# Altium footprint library LukaLIBRARY.PcbLib: 784 footprints (part 22 of 49)
Each footprint in its own frame and in the unit in brackets; x right, y up, seen from the top. Pads: shape width x height; smd on the part's side, far side on the other; paste and mask are expansions set on the pad; w line width, h text height; cw(c..) or ccw(c..) is an arc to the next point about the centre after c.
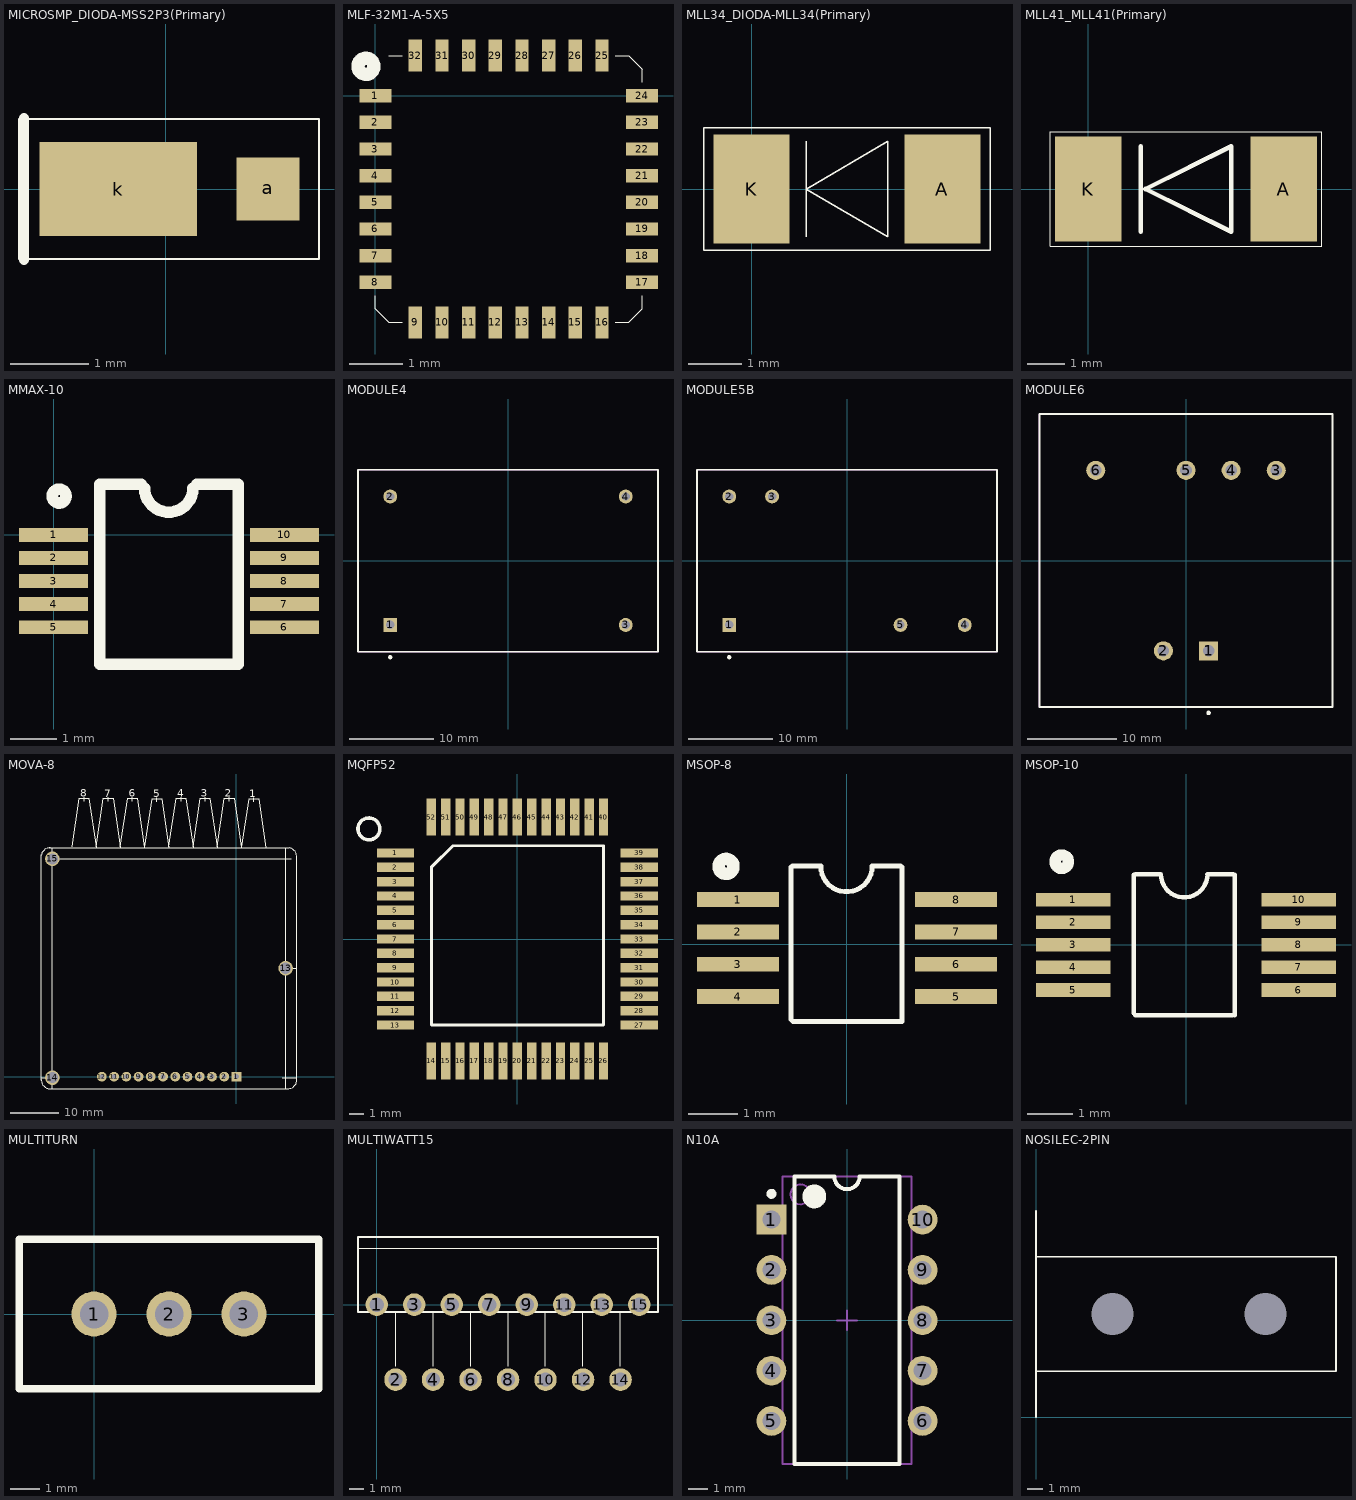
[diagram p21: the footprints below, top view; thin cyan lines are the x and y axes]

## MICROSMP_DIODA-MSS2P3(Primary) [mm]
pads (2):
  rect 0.8x0.8 smd mask-25.4: a(1.3,0)
  rect 2x1.2 smd mask-25.4: k(-0.6,0)
Top Overlay:
  lines w0.025: -1.862,-0.889 -1.862,0.889 1.948,0.889 1.948,-0.889 -1.862,-0.889
  lines w0.127: -1.8,-0.9 -1.8,0.9
Top Solder:
  region: 0.665,-0.711 1.935,-0.711 1.935,0.711 0.665,0.711
  region: 0.111,-0.635 0.111,0.635 -1.311,0.635 -1.311,-0.635

## MLF-32M1-A-5X5 [mm]
pads (32):
  rect 0.6x0.25 smd mask-25.4: 1(0,0) 2(0,-0.5) 3(0,-1) 4(0,-1.5) 5(0,-2) 6(0,-2.5) 7(0,-3) 8(0,-3.5) 17(5,-3.5) 18(5,-3) 19(5,-2.5) 20(5,-2) 21(5,-1.5) 22(5,-1) 23(5,-0.5) 24(5,0)
  rect 0.25x0.6 smd mask-25.4: 9(0.75,-4.25) 10(1.25,-4.25) 11(1.75,-4.25) 12(2.25,-4.25) 13(2.75,-4.25) 14(3.25,-4.25) 15(3.75,-4.25) 16(4.25,-4.25) 25(4.25,0.75) 26(3.75,0.75) 27(3.25,0.75) 28(2.75,0.75) 29(2.25,0.75) 30(1.75,0.75) 31(1.25,0.75) 32(0.75,0.75)
Top Overlay:
  circle w0.25: c-0.175,0.55 r0.15
  lines w0.01: 0,-3.75 0,-4 0.25,-4.25 0.5,-4.25 ; 0.25,0.75 0.5,0.75 ; 4.5,-4.25 4.75,-4.25 5,-4 5,-3.75 ; 4.5,0.75 4.75,0.75 5,0.5 5,0.25
Top Solder:
  region: 2.875,0.45 2.875,1.05 2.625,1.05 2.625,0.45
  region: 2.875,-4.55 2.875,-3.95 2.625,-3.95 2.625,-4.55
  region: 5.3,-2.875 4.7,-2.875 4.7,-3.125 5.3,-3.125
  region: 5.3,-3.375 4.7,-3.375 4.7,-3.625 5.3,-3.625
  region: 0.3,-3.375 -0.3,-3.375 -0.3,-3.625 0.3,-3.625
  region: 0.3,-2.875 -0.3,-2.875 -0.3,-3.125 0.3,-3.125
  region: 3.375,0.45 3.375,1.05 3.125,1.05 3.125,0.45
  region: 3.875,0.45 3.875,1.05 3.625,1.05 3.625,0.45
  region: 4.375,0.45 4.375,1.05 4.125,1.05 4.125,0.45
  region: 5.3,0.125 4.7,0.125 4.7,-0.125 5.3,-0.125
  region: 5.3,-0.375 4.7,-0.375 4.7,-0.625 5.3,-0.625
  region: 5.3,-0.875 4.7,-0.875 4.7,-1.125 5.3,-1.125
  region: 5.3,-1.375 4.7,-1.375 4.7,-1.625 5.3,-1.625
  region: 5.3,-1.875 4.7,-1.875 4.7,-2.125 5.3,-2.125
  region: 5.3,-2.375 4.7,-2.375 4.7,-2.625 5.3,-2.625
  region: 4.375,-4.55 4.375,-3.95 4.125,-3.95 4.125,-4.55
  region: 3.875,-4.55 3.875,-3.95 3.625,-3.95 3.625,-4.55
  region: 3.375,-4.55 3.375,-3.95 3.125,-3.95 3.125,-4.55
  region: 0.3,0.125 -0.3,0.125 -0.3,-0.125 0.3,-0.125
  region: 0.875,0.45 0.875,1.05 0.625,1.05 0.625,0.45
  region: 1.375,0.45 1.375,1.05 1.125,1.05 1.125,0.45
  region: 1.875,0.45 1.875,1.05 1.625,1.05 1.625,0.45
  region: 2.375,0.45 2.375,1.05 2.125,1.05 2.125,0.45
  region: 0.3,-2.375 -0.3,-2.375 -0.3,-2.625 0.3,-2.625
  region: 0.3,-1.875 -0.3,-1.875 -0.3,-2.125 0.3,-2.125
  region: 0.3,-1.375 -0.3,-1.375 -0.3,-1.625 0.3,-1.625
  region: 0.3,-0.875 -0.3,-0.875 -0.3,-1.125 0.3,-1.125
  region: 0.3,-0.375 -0.3,-0.375 -0.3,-0.625 0.3,-0.625
  region: 2.375,-4.55 2.375,-3.95 2.125,-3.95 2.125,-4.55
  region: 1.875,-4.55 1.875,-3.95 1.625,-3.95 1.625,-4.55
  region: 1.375,-4.55 1.375,-3.95 1.125,-3.95 1.125,-4.55
  region: 0.875,-4.55 0.875,-3.95 0.625,-3.95 0.625,-4.55

## MLL34_DIODA-MLL34(Primary) [mil]
pads (2):
  rect 56x80 smd mask-1000: A(140,0) K(0,0)
Top Overlay:
  lines w1: 40,-35 40,35 ; -35,-45 -35,45 175,45 175,-45 -35,-45 ; 40,0 100,35 100,-35 40,0
Top Solder:
  region: -28,-40 28,-40 28,40 -28,40
  region: 112,-40 168,-40 168,40 112,40

## MLL41_MLL41(Primary) [mil]
pads (2):
  rect 70x110 smd: A(205,0) K(0,0)
Top Overlay:
  lines w1: -40,-60 -40,60 245,60 245,-60 -40,-60
  lines w5: 55,-45 55,45 ; 60,0 150,-45 150,45 60,0

## MMAX-10 [mm]
pads (10):
  rect 1.5x0.3 smd: 1(0,0) 2(0,-0.5) 3(0,-1) 4(0,-1.5) 5(0,-2) 6(5,-2) 7(5,-1.5) 8(5,-1) 9(5,-0.5) 10(5,0)
Top Overlay:
  circle w0.25: c0.12,0.84 r0.15
  lines w0.25: 1.9,1.1 1,1.1 1,-2.8 4,-2.8 4,1.1 3.1,1.1 ; 1.971,1.015 ccw(c2.495,1.015) 3.019,1.015

## MODULE4 [mm] "DIP; 4 Round Pins; Row Space 27.94 mm; Pitch 15.24 mm"
height 14
pads (4):
  rect 1.65x1.65 hole 1: 1(-13.97,-7.62)
  round 1.65 hole 1: 2(-13.97,7.62) 3(13.97,-7.62) 4(13.97,7.62)
Top Overlay:
  circle w0.25: c-13.97,-11.45 r0.125
  lines w0.2: -17.8,-10.8 -17.8,10.8 17.8,10.8 17.8,-10.8 -17.8,-10.8
Mechanical 13:
  lines w0.1: -17.8,-10.8 -17.8,10.8 17.8,10.8 17.8,-10.8 -17.8,-10.8
3D body: height 14, standoff 0, extent -17.8,-10.8 17.8,10.8

## MODULE5B [mm] "DIP; 5 Round Pins; Row Space 15.24 mm; Pitch 2.54 mm"
height 14
pads (5):
  rect 1.65x1.65 hole 1: 1(-13.97,-7.62)
  round 1.65 hole 1: 2(-13.97,7.62) 3(-8.89,7.62) 4(13.97,-7.62) 5(6.35,-7.62)
Top Overlay:
  circle w0.25: c-13.97,-11.45 r0.125
  lines w0.2: -17.8,-10.8 17.8,-10.8 17.8,10.8 -17.8,10.8 -17.8,-10.8
Mechanical 13:
  lines w0.1: -17.8,-10.8 -17.8,10.8 17.8,10.8 17.8,-10.8 -17.8,-10.8
3D body: height 14, standoff 0, extent -17.8,-10.8 17.8,10.8

## MODULE6 [mm] "DIP; 6 Round Pins; Row Space 20.32 mm; Pitch 2.54 mm"
height 16.5
pads (6):
  rect 2.15x2.15 hole 1.3: 1(2.54,-10.16)
  round 2.15 hole 1.3: 2(-2.54,-10.16) 3(10.16,10.16) 4(5.08,10.16) 5(0,10.16) 6(-10.16,10.16)
Top Overlay:
  circle w0.25: c2.54,-17.15 r0.125
  lines w0.2: -16.5,-16.5 -16.5,16.5 16.5,16.5 16.5,-16.5 -16.5,-16.5
Mechanical 13:
  lines w0.1: -16.5,-16.5 -16.5,16.5 16.5,16.5 16.5,-16.5 -16.5,-16.5
3D body: height 16.5, standoff 0, extent -16.5,-16.5 16.5,16.5

## MOVA-8 [mil]
pads (15):
  rect 80x80 hole 40 mask-1000: 1(0,0)
  round 80 hole 40 mask-1000: 2(-100,0) 3(-200,0) 4(-300,0) 5(-400,0) 6(-500,0) 7(-600,0) 8(-700,0) 9(-800,0) 10(-900,0) 11(-1000,0) 12(-1100,0)
  round 120 hole 90: 13(401.57,885.83) 14(-1503.94,-7.87) 15(-1503.94,1779.53)
Top Overlay:
  lines w3: -1594.85,1809.42 cw(c-1519.68,1793.31) -1519.68,1870.18 ; -1594.59,-23.62 ccw(c-1517.72,-23.62) -1533.83,-98.79 ; -1594.49,-27.56 -1594.49,1811.02 ; -1594.49,-7.87 -1448.82,-7.87 ; -1555.12,1779.53 448.82,1779.53 ; -1535.43,-98.43 -551.18,-98.43 413.39,-98.43 ; -1527.56,1870.08 429.13,1870.08 ; -1503.94,-98.43 -1503.94,1870.08 ; -1342.52,1877.95 -1283.46,2275.59 -1244.09,2275.59 -1204.72,2275.59 -1145.67,1874.02 ; -1244.09,2248.03 -1244.09,2283.46 ; -1145.67,1877.95 -1086.61,2275.59 -1047.24,2275.59 -1007.87,2275.59 -948.82,1874.02 ; -1047.24,2248.03 -1047.24,2283.46 ; -948.82,1877.95 -889.76,2275.59 -850.39,2275.59 -811.02,2275.59 -751.97,1874.02 ; -850.39,2248.03 -850.39,2283.46 ; -748.03,1874.02 -688.98,2271.65 -649.61,2271.65 -610.24,2271.65 -551.18,1870.08 ; -649.61,2244.09 -649.61,2279.53 ; -551.18,1877.95 -492.13,2275.59 -452.76,2275.59 -413.39,2275.59 -354.33,1874.02 ; -452.76,2248.03 -452.76,2283.46 ; -354.33,1877.95 -295.28,2275.59 -255.91,2275.59 -216.54,2275.59 -157.48,1874.02 ; -255.91,2248.03 -255.91,2283.46 ; -157.48,1877.95 -98.43,2275.59 -59.06,2275.59 -19.68,2275.59 39.37,1874.02 ; -59.06,2248.03 -59.06,2283.46 ; 43.31,1874.02 102.36,2271.65 141.73,2271.65 181.1,2271.65 240.16,1870.08 ; 141.73,2244.09 141.73,2279.53 ; 374.02,-7.87 492.13,-7.87 492.13,-39.37 ; 401.57,-98.43 401.57,1870.08 ; 417.32,-98.53 ccw(c417.32,-21.65) 492.49,-37.77 ; 431.47,1870.44 cw(c415.35,1795.28) 492.23,1795.28 ; 452.76,885.83 492.13,885.83 ; 492.13,-35.43 492.13,1799.21
  text "8" at -1275.59,2287.4 h62.5
  text "6" at -881.89,2287.4 h62.5
  text "4" at -484.25,2287.4 h62.5
  text "5" at -681.1,2283.46 h62.5
  text "3" at -291.34,2287.4 h62.5
  text "1" at 106.3,2283.46 h62.5
  text "7" at -1078.74,2283.46 h62.5
  text "2" at -94.49,2287.4 h62.5
Top Solder:
  drawing of 12 lines, arcs and shapes, not listed
Bottom Solder:
  drawing of 12 lines, arcs and shapes, not listed

## MQFP52 [mm]
pads (52):
  rect 2.6x0.65 smd: 1(-8.5,6) 2(-8.5,5) 3(-8.5,4) 4(-8.5,3) 5(-8.5,2) 6(-8.5,1) 7(-8.5,0) 8(-8.5,-1) 9(-8.5,-2) 10(-8.5,-3) 11(-8.5,-4) 12(-8.5,-5) 13(-8.5,-6) 27(8.5,-6) 28(8.5,-5) 29(8.5,-4) 30(8.5,-3) 31(8.5,-2) 32(8.5,-1) 33(8.5,0) 34(8.5,1) 35(8.5,2) 36(8.5,3) 37(8.5,4) 38(8.5,5) 39(8.5,6)
  rect 0.65x2.6 smd: 14(-6,-8.5) 15(-5,-8.5) 16(-4,-8.5) 17(-3,-8.5) 18(-2,-8.5) 19(-1,-8.5) 20(0,-8.5) 21(1,-8.5) 22(2,-8.5) 23(3,-8.5) 24(4,-8.5) 25(5,-8.5) 26(6,-8.5) 40(6,8.5) 41(5,8.5) 42(4,8.5) 43(3,8.5) 44(2,8.5) 45(1,8.5) 46(0,8.5) 47(-1,8.5) 48(-2,8.5) 49(-3,8.5) 50(-4,8.5) 51(-5,8.5) 52(-6,8.5)
Top Overlay:
  circle w0.25: c-10.35,7.675 r0.76
  lines w0.2: -6,-6 -6,5 -4.5,6.5 6,6.5 6,-6 -6,-6

## MSOP-8 [mm]
pads (8):
  rect 1.65x0.3 smd: 1(-2.185,0.895) 2(-2.185,0.245) 3(-2.185,-0.405) 4(-2.185,-1.055) 5(2.205,-1.055) 6(2.205,-0.405) 7(2.205,0.245) 8(2.205,0.895)
Top Overlay:
  circle w0.25: c-2.425,1.565 r0.15
  lines w0.1: -1.12,-1.52 -1.12,1.55 ; -1.09,1.57 -0.517,1.57 ccw(c0,1.57) 0.517,1.57 1.09,1.57 ; -1.08,-1.56 1.08,-1.56 ; 1.12,-1.56 1.12,1.55

## MSOP-10 [mm]
pads (10):
  rect 1.65x0.3 smd: 1(-2.5,1) 2(-2.5,0.5) 3(-2.5,0) 4(-2.5,-0.5) 5(-2.5,-1) 6(2.5,-1) 7(2.5,-0.5) 8(2.5,0) 9(2.5,0.5) 10(2.5,1)
Top Overlay:
  circle w0.25: c-2.755,1.845 r0.15
  lines w0.1: -1.16,-1.52 -1.16,1.55 ; -1.13,1.57 -0.557,1.57 ccw(c-0.04,1.57) 0.477,1.57 1.05,1.57 ; -1.12,-1.56 1.04,-1.56 ; 1.08,-1.56 1.08,1.55

## MULTITURN [mil]
pads (3):
  round 60 hole 38: 1(0,0) 2(100,0) 3(200,0)
Top Overlay:
  lines w10: -100,-100 -100,100 300,100 300,-100 -100,-100

## MULTIWATT15 [mil]
pads (15):
  round 60 hole 38: 1(0,0) 2(50,-200) 3(100,0) 4(150,-200) 5(200,0) 6(250,-200) 7(300,0) 8(350,-200) 9(400,0) 10(450,-200) 11(500,0) 12(550,-200) 13(600,0) 14(650,-200) 15(700,0)
Top Overlay:
  lines w1: -50,150 750,150 ; 50,-165 50,-20 ; 150,-165 150,-20 ; 250,-165 250,-20 ; 350,-165 350,-20 ; 450,-165 450,-20 ; 550,-165 550,-20 ; 650,-165 650,-20
  lines w5: -50,-20 -50,180 750,180 750,-20 -50,-20

## N10A [mm] "DIP; 10 Leads; Row Spacing 7.62 mm; Pitch 2.54 mm"
height 5.08
pads (10):
  rect 1.5x1.5 hole 0.9: 1(-3.81,5.08)
  round 1.5 hole 0.9: 2(-3.81,2.54) 3(-3.81,0) 4(-3.81,-2.54) 5(-3.81,-5.08) 6(3.81,-5.08) 7(3.81,-2.54) 8(3.81,0) 9(3.81,2.54) 10(3.81,5.08)
Top Overlay:
  circle w0.25: c-3.81,6.38 r0.125
  circle w0.6: c-1.65,6.25 r0.3
  lines w0.2: -2.65,-7.25 -2.65,7.25 -0.635,7.25 ccw(c0,7.25) 0.635,7.25 2.65,7.25 2.65,-7.25 -2.65,-7.25
Mechanical 13:
  circle w0.1: c-2.35,6.35 r0.5
  lines w0.1: -3.25,-7.25 -3.25,7.25 3.25,7.25 3.25,-7.25 -3.25,-7.25
Mechanical 15:
  lines w0.1: -0.5,0 0.5,0 ; 0,-0.5 0,0.5
3D body: height 5.08, standoff 0, extent -3.25,-7.25 3.25,7.25

## NOSILEC-2PIN [mil]
pads (2):
  round 0 hole 110 mask-1000: 1(200,270) 2(600,270)
Top Overlay:
  lines w3.94: 0,0 0,270 0,540 ; 0,120 0,420 785,420 785,120 0,120
Top Solder:
  region: 200,370.48 180.4,368.55 161.55,362.83 144.17,353.55 128.95,341.05 116.45,325.83 107.17,308.45 101.45,289.6 99.52,270 101.45,250.4 107.17,231.55 116.45,214.17 128.95,198.95 144.17,186.45 161.55,177.16 180.4,171.45 200,169.52 219.6,171.45 238.45,177.16 255.83,186.45 271.05,198.95 283.55,214.17 292.83,231.55 298.55,250.4 300.48,270 298.55,289.6 292.83,308.45 283.55,325.83 271.05,341.05 255.83,353.55 238.45,362.83 219.6,368.55
  region: 600,370.48 580.4,368.55 561.55,362.83 544.17,353.55 528.95,341.05 516.45,325.83 507.17,308.45 501.45,289.6 499.52,270 501.45,250.4 507.17,231.55 516.45,214.17 528.95,198.95 544.17,186.45 561.55,177.16 580.4,171.45 600,169.52 619.6,171.45 638.45,177.16 655.83,186.45 671.05,198.95 683.55,214.17 692.84,231.55 698.55,250.4 700.48,270 698.55,289.6 692.84,308.45 683.55,325.83 671.05,341.05 655.83,353.55 638.45,362.83 619.6,368.55
Bottom Solder:
  region: 200,370.48 180.4,368.55 161.55,362.83 144.17,353.55 128.95,341.05 116.45,325.83 107.17,308.45 101.45,289.6 99.52,270 101.45,250.4 107.17,231.55 116.45,214.17 128.95,198.95 144.17,186.45 161.55,177.16 180.4,171.45 200,169.52 219.6,171.45 238.45,177.16 255.83,186.45 271.05,198.95 283.55,214.17 292.83,231.55 298.55,250.4 300.48,270 298.55,289.6 292.83,308.45 283.55,325.83 271.05,341.05 255.83,353.55 238.45,362.83 219.6,368.55
  region: 600,370.48 580.4,368.55 561.55,362.83 544.17,353.55 528.95,341.05 516.45,325.83 507.17,308.45 501.45,289.6 499.52,270 501.45,250.4 507.17,231.55 516.45,214.17 528.95,198.95 544.17,186.45 561.55,177.16 580.4,171.45 600,169.52 619.6,171.45 638.45,177.16 655.83,186.45 671.05,198.95 683.55,214.17 692.84,231.55 698.55,250.4 700.48,270 698.55,289.6 692.84,308.45 683.55,325.83 671.05,341.05 655.83,353.55 638.45,362.83 619.6,368.55